# Altium footprint library ConnectorsTDH.PcbLib: 194 footprints (part 2 of 13)
Each footprint in its own frame and in the unit in brackets; x right, y up, seen from the top. Pads: shape width x height; smd on the part's side, far side on the other; paste and mask are expansions set on the pad; w line width, h text height; cw(c..) or ccw(c..) is an arc to the next point about the centre after c.
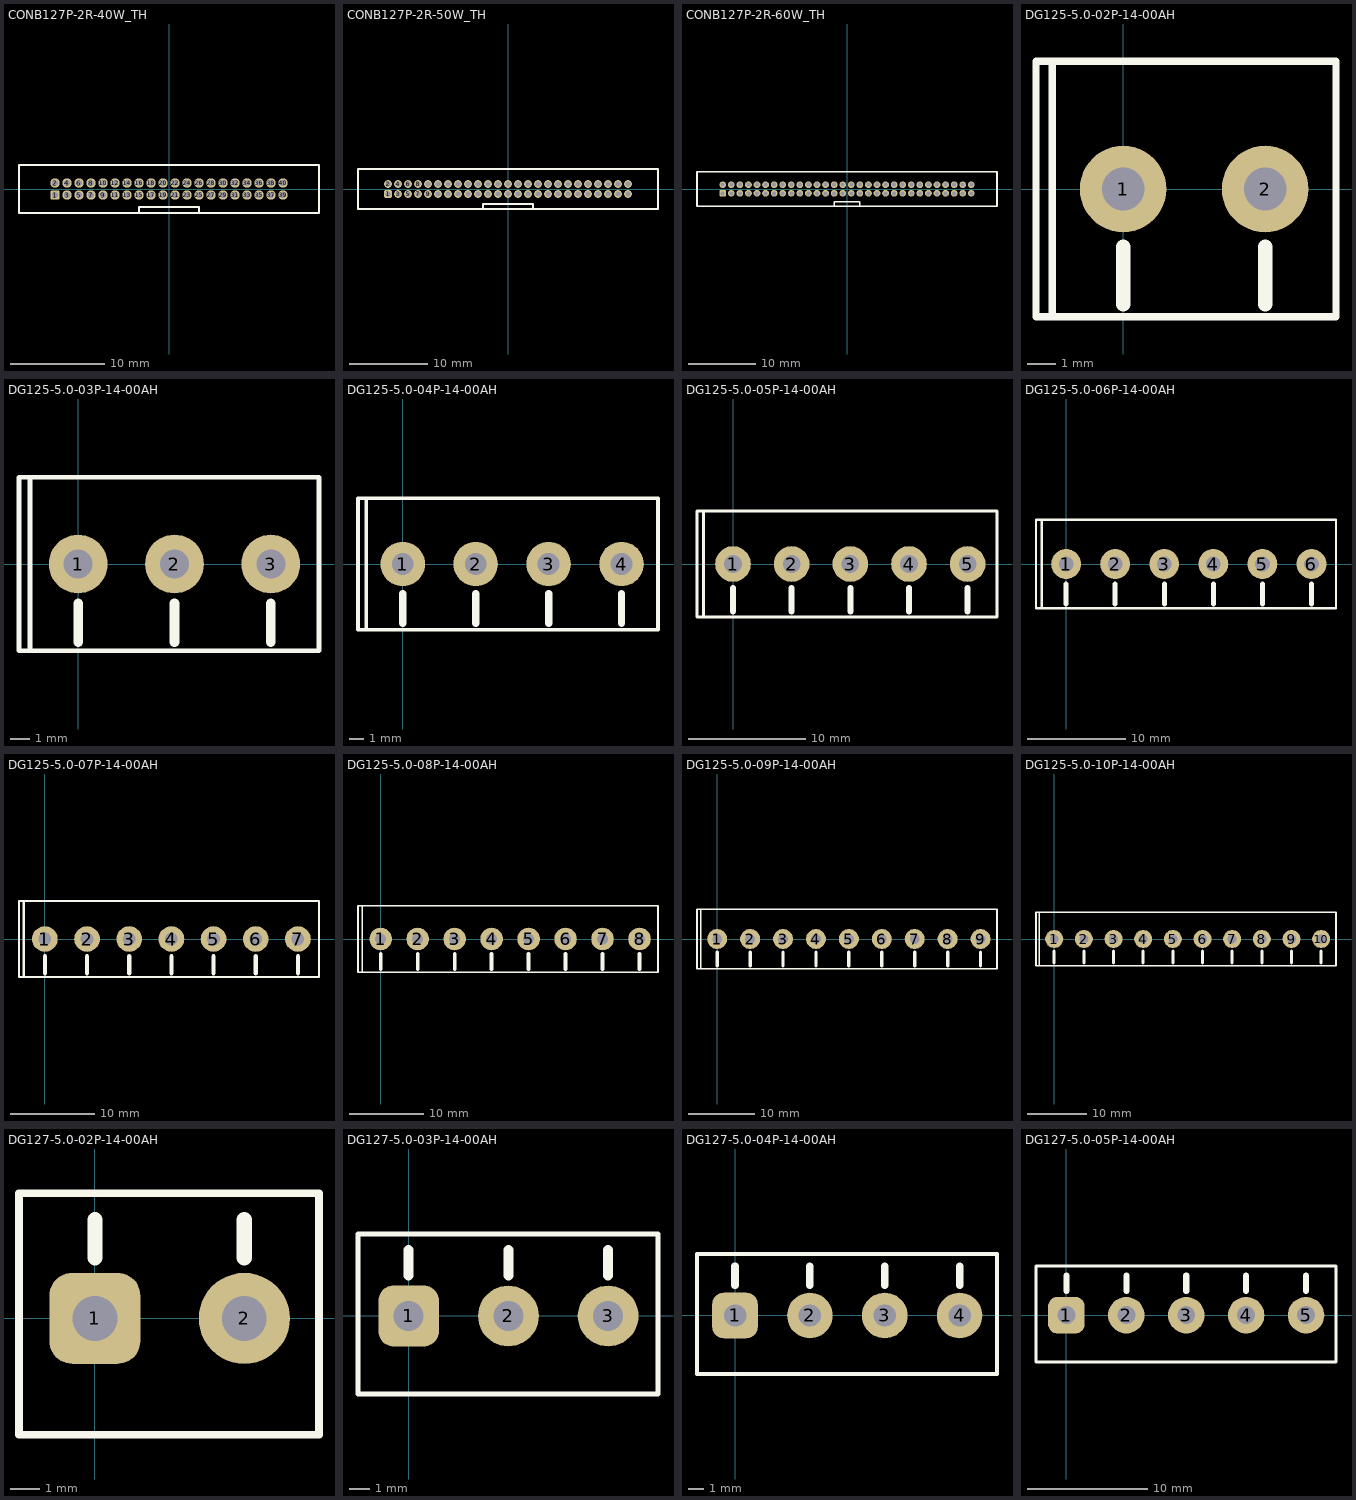
[diagram p1: the footprints below, top view; thin cyan lines are the x and y axes]

## CONB127P-2R-40W_TH [mm]
pads (40):
  rrect50% 1x1 hole 0.6: 1(-12.065,-0.635)
  round 1 hole 0.6: 2(-12.065,0.635) 3(-10.795,-0.635) 4(-10.795,0.635) 5(-9.525,-0.635) 6(-9.525,0.635) 7(-8.255,-0.635) 8(-8.255,0.635) 9(-6.985,-0.635) 10(-6.985,0.635) 11(-5.715,-0.635) 12(-5.715,0.635) 13(-4.445,-0.635) 14(-4.445,0.635) 15(-3.175,-0.635) 16(-3.175,0.635) 17(-1.905,-0.635) 18(-1.905,0.635) 19(-0.635,-0.635) 20(-0.635,0.635) 21(0.635,-0.635) 22(0.635,0.635) 23(1.905,-0.635) 24(1.905,0.635) 25(3.175,-0.635) 26(3.175,0.635) 27(4.445,-0.635) 28(4.445,0.635) 29(5.715,-0.635) 30(5.715,0.635) 31(6.985,-0.635) 32(6.985,0.635) 33(8.255,-0.635) 34(8.255,0.635) 35(9.525,-0.635) 36(9.525,0.635) 37(10.795,-0.635) 38(10.795,0.635) 39(12.065,-0.635) 40(12.065,0.635)
Top Overlay:
  lines w0.254: -3.175,-2.54 -3.175,-1.905 3.175,-1.905 3.175,-2.54 ; -15.875,-2.54 15.875,-2.54 15.875,2.54 -15.875,2.54 -15.875,-2.54
3D body "CONB127P-2R-40W_TH.STEP": height 5.4, standoff -2.1, extent -15.85,-2.65 15.85,2.55

## CONB127P-2R-50W_TH [mm]
pads (50):
  rrect50% 1x1 hole 0.6: 1(-15.24,-0.635)
  round 1 hole 0.6: 2(-15.24,0.635) 3(-13.97,-0.635) 4(-13.97,0.635) 5(-12.7,-0.635) 6(-12.7,0.635) 7(-11.43,-0.635) 8(-11.43,0.635) 9(-10.16,-0.635) 10(-10.16,0.635) 11(-8.89,-0.635) 12(-8.89,0.635) 13(-7.62,-0.635) 14(-7.62,0.635) 15(-6.35,-0.635) 16(-6.35,0.635) 17(-5.08,-0.635) 18(-5.08,0.635) 19(-3.81,-0.635) 20(-3.81,0.635) 21(-2.54,-0.635) 22(-2.54,0.635) 23(-1.27,-0.635) 24(-1.27,0.635) 25(0,-0.635) 26(0,0.635) 27(1.27,-0.635) 28(1.27,0.635) 29(2.54,-0.635) 30(2.54,0.635) 31(3.81,-0.635) 32(3.81,0.635) 33(5.08,-0.635) 34(5.08,0.635) 35(6.35,-0.635) 36(6.35,0.635) 37(7.62,-0.635) 38(7.62,0.635) 39(8.89,-0.635) 40(8.89,0.635) 41(10.16,-0.635) 42(10.16,0.635) 43(11.43,-0.635) 44(11.43,0.635) 45(12.7,-0.635) 46(12.7,0.635) 47(13.97,-0.635) 48(13.97,0.635) 49(15.24,-0.635) 50(15.24,0.635)
Top Overlay:
  lines w0.254: -3.175,-2.54 -3.175,-1.905 3.175,-1.905 3.175,-2.54 ; -19.05,-2.54 19.05,-2.54 19.05,2.54 -19.05,2.54 -19.05,-2.54
3D body "CONB127P-2R-50W_TH.STEP": height 5.4, standoff -2.1, extent -19.025,-2.65 19.025,2.55

## CONB127P-2R-60W_TH [mm]
pads (60):
  rrect50% 1x1 hole 0.6: 1(-18.415,-0.635)
  round 1 hole 0.6: 2(-18.415,0.635) 3(-17.145,-0.635) 4(-17.145,0.635) 5(-15.875,-0.635) 6(-15.875,0.635) 7(-14.605,-0.635) 8(-14.605,0.635) 9(-13.335,-0.635) 10(-13.335,0.635) 11(-12.065,-0.635) 12(-12.065,0.635) 13(-10.795,-0.635) 14(-10.795,0.635) 15(-9.525,-0.635) 16(-9.525,0.635) 17(-8.255,-0.635) 18(-8.255,0.635) 19(-6.985,-0.635) 20(-6.985,0.635) 21(-5.715,-0.635) 22(-5.715,0.635) 23(-4.445,-0.635) 24(-4.445,0.635) 25(-3.175,-0.635) 26(-3.175,0.635) 27(-1.905,-0.635) 28(-1.905,0.635) 29(-0.635,-0.635) 30(-0.635,0.635) 31(0.635,-0.635) 32(0.635,0.635) 33(1.905,-0.635) 34(1.905,0.635) 35(3.175,-0.635) 36(3.175,0.635) 37(4.445,-0.635) 38(4.445,0.635) 39(5.715,-0.635) 40(5.715,0.635) 41(6.985,-0.635) 42(6.985,0.635) 43(8.255,-0.635) 44(8.255,0.635) 45(9.525,-0.635) 46(9.525,0.635) 47(10.795,-0.635) 48(10.795,0.635) 49(12.065,-0.635) 50(12.065,0.635) 51(13.335,-0.635) 52(13.335,0.635) 53(14.605,-0.635) 54(14.605,0.635) 55(15.875,-0.635) 56(15.875,0.635) 57(17.145,-0.635) 58(17.145,0.635) 59(18.415,-0.635) 60(18.415,0.635)
Top Overlay:
  lines w0.254: -1.905,-2.54 -1.905,-1.905 1.905,-1.905 1.905,-2.54 ; -22.225,-2.54 -22.225,2.54 22.225,2.54 22.225,-2.54 -22.225,-2.54
3D body "CONB127P-2R-60W_TH.STEP": height 5.4, standoff -2.1, extent -22.2,-2.65 22.2,2.55

## DG125-5.0-02P-14-00AH [mil]
pads (2):
  round 120 hole 59.06: 1(0,0) 2(196.85,0)
Top Overlay:
  lines w10: -98.43,-177.17 295.28,-177.17 295.28,177.17 -98.43,177.17 ; -98.43,-177.17 -98.43,177.17 ; -98.43,-177.17 -120.87,-177.17 -120.87,177.17 -98.43,177.17
  lines w20: 0,-160 0,-80 ; 196.85,-160 196.85,-80
3D body "DG125-5.0-02P-14-00AH.STEP": height 535.43, standoff -137.8, extent -120.86,-177.16 295.28,177.16

## DG125-5.0-03P-14-00AH [mil]
pads (3):
  round 120 hole 59.06: 1(0,0) 2(196.85,0) 3(393.7,0)
Top Overlay:
  lines w10: -98.43,-177.17 492.13,-177.17 492.13,177.17 -98.43,177.17 ; -98.43,-177.17 -98.43,177.17 ; -98.43,-177.17 -120.87,-177.17 -120.87,177.17 -98.43,177.17
  lines w20: 0,-160 0,-80 ; 196.85,-160 196.85,-80 ; 393.7,-160 393.7,-80
3D body "DG125-5.0-03P-14-00AH.STEP": height 535.43, standoff -137.8, extent -120.86,-177.16 492.13,177.17

## DG125-5.0-04P-14-00AH [mil]
pads (4):
  round 120 hole 59.06: 1(0,0) 2(196.85,0) 3(393.7,0) 4(590.55,0)
Top Overlay:
  lines w10: -98.43,-177.17 -120.87,-177.17 -120.87,177.17 -98.43,177.17 ; -98.43,-177.17 -98.43,177.17 ; -98.43,-177.17 688.98,-177.17 688.98,177.17 -98.43,177.17
  lines w20: 0,-160 0,-80 ; 196.85,-160 196.85,-80 ; 393.7,-160 393.7,-80 ; 590.55,-160 590.55,-80
3D body "DG125-5.0-04P-14-00AH.STEP": height 535.43, standoff -137.8, extent -120.86,-177.16 688.98,177.17

## DG125-5.0-05P-14-00AH [mil]
pads (5):
  round 120 hole 59.06: 1(0,0) 2(196.85,0) 3(393.7,0) 4(590.55,0) 5(787.4,0)
Top Overlay:
  lines w10: -98.43,-177.17 -120.87,-177.17 -120.87,177.17 -98.43,177.17 ; -98.43,-177.17 -98.43,177.17 ; -98.43,-177.17 885.83,-177.17 885.83,177.17 -98.43,177.17
  lines w20: 0,-160 0,-80 ; 196.85,-160 196.85,-80 ; 393.7,-160 393.7,-80 ; 590.55,-160 590.55,-80 ; 787.4,-160 787.4,-80
3D body "DG125-5.0-05P-14-00AH.STEP": height 535.43, standoff -137.8, extent -120.86,-177.16 885.83,177.17

## DG125-5.0-06P-14-00AH [mil]
pads (6):
  round 120 hole 59.06: 1(0,0) 2(196.85,0) 3(393.7,0) 4(590.55,0) 5(787.4,0) 6(984.25,0)
Top Overlay:
  lines w10: -98.43,-177.17 1082.68,-177.17 1082.68,177.17 -98.43,177.17 ; -98.43,-177.17 -98.43,177.17 ; -98.43,-177.17 -120.87,-177.17 -120.87,177.17 -98.43,177.17
  lines w20: 0,-160 0,-80 ; 196.85,-160 196.85,-80 ; 393.7,-160 393.7,-80 ; 590.55,-160 590.55,-80 ; 787.4,-160 787.4,-80 ; 984.25,-160 984.25,-80
3D body "DG125-5.0-06P-14-00AH.STEP": height 535.43, standoff -137.8, extent -120.86,-177.16 1082.68,177.17

## DG125-5.0-07P-14-00AH [mil]
pads (7):
  round 120 hole 59.06: 1(0,0) 2(196.85,0) 3(393.7,0) 4(590.55,0) 5(787.4,0) 6(984.25,0) 7(1181.1,0)
Top Overlay:
  lines w10: -98.43,-177.17 1279.53,-177.17 1279.53,177.17 -98.43,177.17 ; -98.43,-177.17 -98.43,177.17 ; -98.43,-177.17 -120.87,-177.17 -120.87,177.17 -98.43,177.17
  lines w20: 0,-160 0,-80 ; 196.85,-160 196.85,-80 ; 393.7,-160 393.7,-80 ; 590.55,-160 590.55,-80 ; 787.4,-160 787.4,-80 ; 984.25,-160 984.25,-80 ; 1181.1,-160 1181.1,-80
3D body "DG125-5.0-07P-14-00AH.STEP": height 535.43, standoff -137.8, extent -120.86,-177.16 1279.53,177.17

## DG125-5.0-08P-14-00AH [mil]
pads (8):
  round 120 hole 59.06: 1(0,0) 2(196.85,0) 3(393.7,0) 4(590.55,0) 5(787.4,0) 6(984.25,0) 7(1181.1,0) 8(1377.95,0)
Top Overlay:
  lines w10: -98.43,-177.17 1476.38,-177.17 1476.38,177.17 -98.43,177.17 ; -98.43,-177.17 -98.43,177.17 ; -98.43,-177.17 -120.87,-177.17 -120.87,177.17 -98.43,177.17
  lines w20: 0,-160 0,-80 ; 196.85,-160 196.85,-80 ; 393.7,-160 393.7,-80 ; 590.55,-160 590.55,-80 ; 787.4,-160 787.4,-80 ; 984.25,-160 984.25,-80 ; 1181.1,-160 1181.1,-80 ; 1377.95,-160 1377.95,-80
3D body "DG125-5.0-08P-14-00AH.STEP": height 535.43, standoff -137.8, extent -120.86,-177.16 1476.38,177.17

## DG125-5.0-09P-14-00AH [mil]
pads (9):
  round 120 hole 59.06: 1(0,0) 2(196.85,0) 3(393.7,0) 4(590.55,0) 5(787.4,0) 6(984.25,0) 7(1181.1,0) 8(1377.95,0) 9(1574.8,0)
Top Overlay:
  lines w10: -98.43,-177.17 -120.87,-177.17 -120.87,177.17 -98.43,177.17 ; -98.43,-177.17 -98.43,177.17 ; -98.43,-177.17 1673.23,-177.17 1673.23,177.17 -98.43,177.17
  lines w20: 0,-160 0,-80 ; 196.85,-160 196.85,-80 ; 393.7,-160 393.7,-80 ; 590.55,-160 590.55,-80 ; 787.4,-160 787.4,-80 ; 984.25,-160 984.25,-80 ; 1181.1,-160 1181.1,-80 ; 1377.95,-160 1377.95,-80 ; 1574.8,-160 1574.8,-80
3D body "DG125-5.0-09P-14-00AH.STEP": height 535.43, standoff -137.8, extent -120.86,-177.16 1673.23,177.17

## DG125-5.0-10P-14-00AH [mil]
pads (10):
  round 120 hole 59.06: 1(0,0) 2(196.85,0) 3(393.7,0) 4(590.55,0) 5(787.4,0) 6(984.25,0) 7(1181.1,0) 8(1377.95,0) 9(1574.8,0) 10(1771.65,0)
Top Overlay:
  lines w10: -98.43,-177.17 1870.08,-177.17 1870.08,177.17 -98.43,177.17 ; -98.43,-177.17 -98.43,177.17 ; -98.43,-177.17 -120.87,-177.17 -120.87,177.17 -98.43,177.17
  lines w20: 0,-160 0,-80 ; 196.85,-160 196.85,-80 ; 393.7,-160 393.7,-80 ; 590.55,-160 590.55,-80 ; 787.4,-160 787.4,-80 ; 984.25,-160 984.25,-80 ; 1181.1,-160 1181.1,-80 ; 1377.95,-160 1377.95,-80 ; 1574.8,-160 1574.8,-80 ; 1771.65,-160 1771.65,-80
3D body "DG125-5.0-10P-14-00AH.STEP": height 535.43, standoff -137.8, extent -120.86,-177.16 1870.08,177.17

## DG127-5.0-02P-14-00AH [mil]
pads (2):
  rrect50% 120x120 hole 59.06: 1(0,0)
  round 120 hole 59.06: 2(196.85,0)
Top Overlay:
  lines w10: -100,-153.54 -100,165.1 295.28,165.1 295.28,-153.54 -100,-153.54
  lines w20: 0,80 0,130 ; 196.85,80 196.85,130
3D body "DG127-5.0-02P-14.stp": height 397.64, standoff -145.63, extent -98.43,-153.55 314.96,165.35

## DG127-5.0-03P-14-00AH [mil]
pads (3):
  rrect50% 120x120 hole 59.06: 1(0,0)
  round 120 hole 59.06: 2(196.85,0) 3(393.7,0)
Top Overlay:
  lines w10: -100,-153.54 492.13,-153.54 492.13,161.42 -100,161.42 -100,-153.54
  lines w20: 0,80 0,130 ; 196.85,80 196.85,130 ; 393.7,80 393.7,130
3D body "DG127-5.0-03P-14.stp": height 397.64, standoff -145.63, extent -98.43,-153.55 511.8,165.34

## DG127-5.0-04P-14-00AH [mil]
pads (4):
  rrect50% 120x120 hole 59.06: 1(0,0)
  round 120 hole 59.06: 2(196.85,0) 3(393.7,0) 4(590.55,0)
Top Overlay:
  lines w10: -100,-153.54 -100,161.42 688.98,161.42 688.98,-153.54 -100,-153.54
  lines w20: 0,80 0,130 ; 196.85,80 196.85,130 ; 393.7,80 393.7,130 ; 590.55,80 590.55,130
3D body "DG127-5.0-04P-14.stp": height 397.64, standoff -145.63, extent -98.43,-153.55 708.66,165.35

## DG127-5.0-05P-14-00AH [mil]
pads (5):
  rrect50% 120x120 hole 59.06: 1(0,0)
  round 120 hole 59.06: 2(196.85,0) 3(393.7,0) 4(590.55,0) 5(787.4,0)
Top Overlay:
  lines w10: -100,-153.54 -100,161.42 885.83,161.42 885.83,-153.54 -100,-153.54
  lines w20: 0,80 0,130 ; 196.85,80 196.85,130 ; 393.7,80 393.7,130 ; 590.55,80 590.55,130 ; 787.4,80 787.4,130
3D body "DG127-5.0-05P-14.stp": height 397.64, standoff -145.63, extent -98.43,-153.54 905.51,165.35